# Altium footprint library 排针-排母-1.27.PcbLib: 152 footprints (part 4 of 10)
Each footprint in its own frame and in the unit in brackets; x right, y up, seen from the top. Pads: shape width x height; smd on the part's side, far side on the other; paste and mask are expansions set on the pad; w line width, h text height; cw(c..) or ccw(c..) is an arc to the next point about the centre after c.
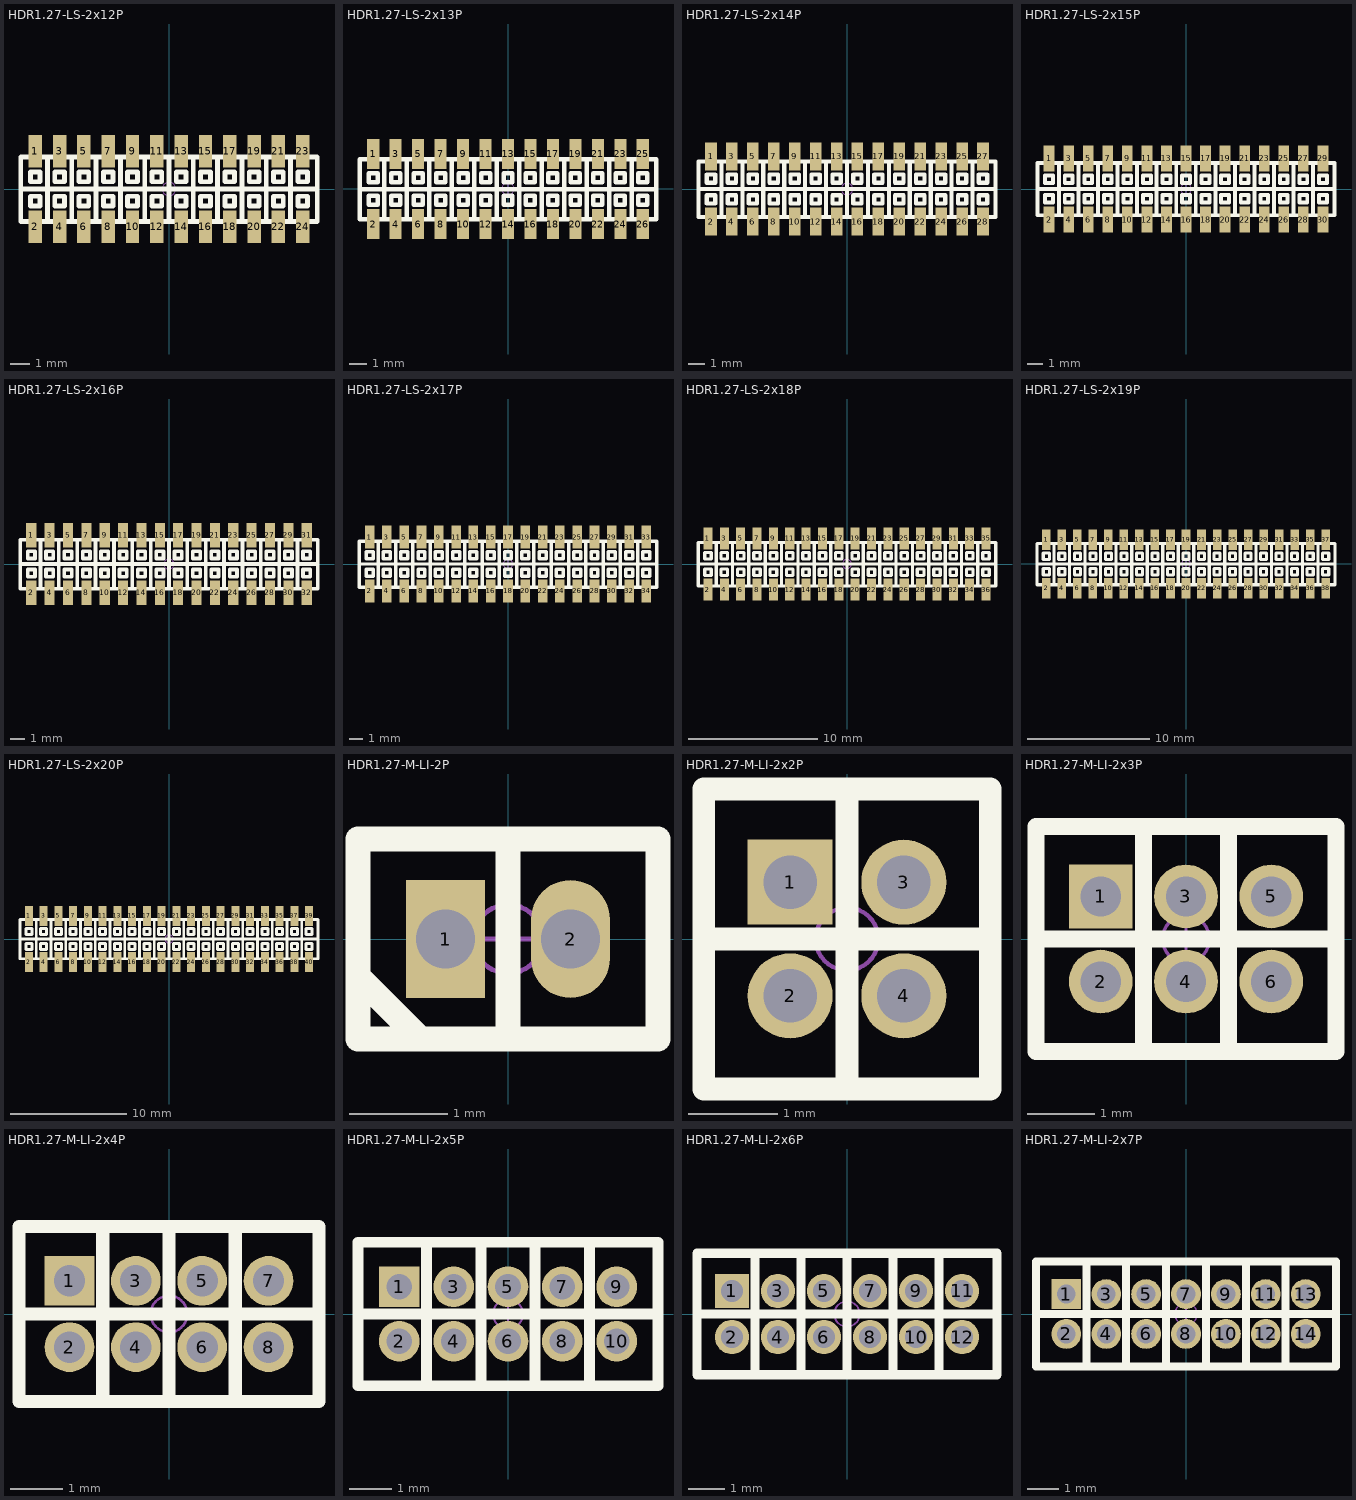
[diagram p3: the footprints below, top view; thin cyan lines are the x and y axes]

## HDR1.27-LS-2x12P [mm] "双排贴片排针，脚距：1.27mm"
pads (24):
  rect 0.7x1.7 smd: 1(-6.985,1.994) 2(-6.985,-1.968) 3(-5.715,1.994) 4(-5.715,-1.968) 5(-4.445,1.994) 6(-4.445,-1.968) 7(-3.175,1.994) 8(-3.175,-1.968) 9(-1.905,1.994) 10(-1.905,-1.968) 11(-0.635,1.994) 12(-0.635,-1.968) 13(0.635,1.994) 14(0.635,-1.968) 15(1.905,1.994) 16(1.905,-1.968) 17(3.175,1.994) 18(3.175,-1.968) 19(4.445,1.994) 20(4.445,-1.968) 21(5.715,1.994) 22(5.715,-1.968) 23(6.985,1.994) 24(6.985,-1.968)
Top Overlay:
  lines w0.254: -7.747,0.013 7.747,0.013 ; -6.35,-1.689 -6.35,1.689 ; -5.08,-1.689 -5.08,1.689 ; -3.81,-1.689 -3.81,1.689 ; -2.54,-1.689 -2.54,1.689 ; -1.27,-1.689 -1.27,1.689 ; 0,-1.689 0,1.689 ; 1.27,-1.689 1.27,1.689 ; 2.54,-1.689 2.54,1.689 ; 3.81,-1.689 3.81,1.689 ; 5.08,-1.689 5.08,1.689 ; 6.35,-1.689 6.35,1.689 ; -7.747,-1.689 7.747,-1.689 7.747,1.689 -7.747,1.689 -7.747,-1.689 ; -7.239,-0.876 -7.239,-0.368 -6.731,-0.368 -6.731,-0.876 -7.239,-0.876 ; -7.239,0.394 -6.731,0.394 -6.731,0.902 -7.239,0.902 -7.239,0.394 ; -5.969,-0.876 -5.461,-0.876 -5.461,-0.368 -5.969,-0.368 -5.969,-0.876 ; -5.969,0.394 -5.969,0.902 -5.461,0.902 -5.461,0.394 -5.969,0.394 ; -4.699,-0.876 -4.191,-0.876 -4.191,-0.368 -4.699,-0.368 -4.699,-0.876 ; -4.699,0.394 -4.699,0.902 -4.191,0.902 -4.191,0.394 -4.699,0.394 ; -3.429,-0.876 -2.921,-0.876 -2.921,-0.368 -3.429,-0.368 -3.429,-0.876 ; -3.429,0.394 -3.429,0.902 -2.921,0.902 -2.921,0.394 -3.429,0.394 ; -2.159,-0.876 -1.651,-0.876 -1.651,-0.368 -2.159,-0.368 -2.159,-0.876 ; -2.159,0.394 -2.159,0.902 -1.651,0.902 -1.651,0.394 -2.159,0.394 ; -0.889,-0.876 -0.381,-0.876 -0.381,-0.368 -0.889,-0.368 -0.889,-0.876 ; -0.889,0.394 -0.889,0.902 -0.381,0.902 -0.381,0.394 -0.889,0.394 ; 0.381,-0.876 0.889,-0.876 0.889,-0.368 0.381,-0.368 0.381,-0.876 ; 0.381,0.394 0.381,0.902 0.889,0.902 0.889,0.394 0.381,0.394 ; 1.651,-0.876 2.159,-0.876 2.159,-0.368 1.651,-0.368 1.651,-0.876 ; 1.651,0.394 1.651,0.902 2.159,0.902 2.159,0.394 1.651,0.394 ; 2.921,-0.876 3.429,-0.876 3.429,-0.368 2.921,-0.368 2.921,-0.876 ; 2.921,0.394 2.921,0.902 3.429,0.902 3.429,0.394 2.921,0.394 ; 4.191,-0.876 4.699,-0.876 4.699,-0.368 4.191,-0.368 4.191,-0.876 ; 4.191,0.394 4.191,0.902 4.699,0.902 4.699,0.394 4.191,0.394 ; 5.461,-0.876 5.969,-0.876 5.969,-0.368 5.461,-0.368 5.461,-0.876 ; 5.461,0.394 5.461,0.902 5.969,0.902 5.969,0.394 5.461,0.394 ; 6.731,-0.876 6.731,-0.368 7.239,-0.368 7.239,-0.876 6.731,-0.876 ; 6.731,0.394 7.239,0.394 7.239,0.902 6.731,0.902 6.731,0.394
Mechanical 15:
  circle w0.05: c0,0.013 r0.35
  lines w0.05: -0.5,0.013 0.5,0.013 ; 0,-0.487 0,0.513
3D body: height 4.25, standoff 0.04, extent -7.62,-2.737 -6.35,2.763
3D body: height 4.25, standoff 0.04, extent -6.35,-2.737 -5.08,2.763
3D body: height 4.25, standoff 0.04, extent -5.08,-2.737 -3.81,2.763
3D body: height 4.25, standoff 0.04, extent -3.81,-2.737 -2.54,2.763
3D body: height 4.25, standoff 0.04, extent -2.54,-2.737 -1.27,2.763
3D body: height 4.25, standoff 0.04, extent -1.27,-2.737 0,2.763
3D body: height 4.25, standoff 0.04, extent 0,-2.737 1.27,2.763
3D body: height 4.25, standoff 0.04, extent 1.27,-2.737 2.54,2.763
3D body: height 4.25, standoff 0.04, extent 2.54,-2.737 3.81,2.763
3D body: height 4.25, standoff 0.04, extent 3.81,-2.737 5.08,2.763
3D body: height 4.25, standoff 0.04, extent 5.08,-2.737 6.35,2.763
3D body: height 4.25, standoff 0.04, extent 6.35,-2.737 7.62,2.763

## HDR1.27-LS-2x13P [mm] "双排贴片排针，脚距：1.27mm"
pads (26):
  rect 0.7x1.7 smd: 1(-7.62,1.968) 2(-7.62,-1.994) 3(-6.35,1.968) 4(-6.35,-1.994) 5(-5.08,1.968) 6(-5.08,-1.994) 7(-3.81,1.968) 8(-3.81,-1.994) 9(-2.54,1.968) 10(-2.54,-1.994) 11(-1.27,1.968) 12(-1.27,-1.994) 13(0,1.968) 14(0,-1.994) 15(1.27,1.968) 16(1.27,-1.994) 17(2.54,1.968) 18(2.54,-1.994) 19(3.81,1.968) 20(3.81,-1.994) 21(5.08,1.968) 22(5.08,-1.994) 23(6.35,1.968) 24(6.35,-1.994) 25(7.62,1.968) 26(7.62,-1.994)
Top Overlay:
  lines w0.254: -8.382,-0.013 8.382,-0.013 ; -6.985,-1.714 -6.985,1.664 ; -5.715,-1.714 -5.715,1.664 ; -4.445,-1.714 -4.445,1.664 ; -3.175,-1.714 -3.175,1.664 ; -1.905,-1.714 -1.905,1.664 ; -0.635,-1.714 -0.635,1.664 ; 0.635,-1.714 0.635,1.664 ; 1.905,-1.714 1.905,1.664 ; 3.175,-1.714 3.175,1.664 ; 4.445,-1.714 4.445,1.664 ; 5.715,-1.714 5.715,1.664 ; 6.985,-1.714 6.985,1.664 ; -8.382,-1.714 -8.382,1.664 8.382,1.664 8.382,-1.714 -8.382,-1.714 ; -7.874,-0.902 -7.366,-0.902 -7.366,-0.394 -7.874,-0.394 -7.874,-0.902 ; -7.874,0.368 -7.874,0.876 -7.366,0.876 -7.366,0.368 -7.874,0.368 ; -6.604,-0.902 -6.604,-0.394 -6.096,-0.394 -6.096,-0.902 -6.604,-0.902 ; -6.604,0.368 -6.096,0.368 -6.096,0.876 -6.604,0.876 -6.604,0.368 ; -5.334,-0.902 -5.334,-0.394 -4.826,-0.394 -4.826,-0.902 -5.334,-0.902 ; -5.334,0.368 -4.826,0.368 -4.826,0.876 -5.334,0.876 -5.334,0.368 ; -4.064,-0.902 -4.064,-0.394 -3.556,-0.394 -3.556,-0.902 -4.064,-0.902 ; -4.064,0.368 -3.556,0.368 -3.556,0.876 -4.064,0.876 -4.064,0.368 ; -2.794,-0.902 -2.794,-0.394 -2.286,-0.394 -2.286,-0.902 -2.794,-0.902 ; -2.794,0.368 -2.286,0.368 -2.286,0.876 -2.794,0.876 -2.794,0.368 ; -1.524,-0.902 -1.524,-0.394 -1.016,-0.394 -1.016,-0.902 -1.524,-0.902 ; -1.524,0.368 -1.016,0.368 -1.016,0.876 -1.524,0.876 -1.524,0.368 ; -0.254,-0.902 -0.254,-0.394 0.254,-0.394 0.254,-0.902 -0.254,-0.902 ; -0.254,0.368 0.254,0.368 0.254,0.876 -0.254,0.876 -0.254,0.368 ; 1.016,-0.902 1.016,-0.394 1.524,-0.394 1.524,-0.902 1.016,-0.902 ; 1.016,0.368 1.524,0.368 1.524,0.876 1.016,0.876 1.016,0.368 ; 2.286,-0.902 2.286,-0.394 2.794,-0.394 2.794,-0.902 2.286,-0.902 ; 2.286,0.368 2.794,0.368 2.794,0.876 2.286,0.876 2.286,0.368 ; 3.556,-0.902 3.556,-0.394 4.064,-0.394 4.064,-0.902 3.556,-0.902 ; 3.556,0.368 4.064,0.368 4.064,0.876 3.556,0.876 3.556,0.368 ; 4.826,-0.902 4.826,-0.394 5.334,-0.394 5.334,-0.902 4.826,-0.902 ; 4.826,0.368 5.334,0.368 5.334,0.876 4.826,0.876 4.826,0.368 ; 6.096,-0.902 6.096,-0.394 6.604,-0.394 6.604,-0.902 6.096,-0.902 ; 6.096,0.368 6.604,0.368 6.604,0.876 6.096,0.876 6.096,0.368 ; 7.366,-0.902 7.366,-0.394 7.874,-0.394 7.874,-0.902 7.366,-0.902 ; 7.366,0.368 7.874,0.368 7.874,0.876 7.366,0.876 7.366,0.368
Mechanical 15:
  circle w0.05: c0,0 r0.35
  lines w0.05: -0.5,0 0.5,0 ; 0,-0.5 0,0.5
3D body: height 4.25, standoff 0.04, extent 6.985,-2.763 8.255,2.737
3D body: height 4.25, standoff 0.04, extent 5.715,-2.763 6.985,2.737
3D body: height 4.25, standoff 0.04, extent 4.445,-2.763 5.715,2.737
3D body: height 4.25, standoff 0.04, extent 3.175,-2.763 4.445,2.737
3D body: height 4.25, standoff 0.04, extent 1.905,-2.763 3.175,2.737
3D body: height 4.25, standoff 0.04, extent 0.635,-2.763 1.905,2.737
3D body: height 4.25, standoff 0.04, extent -0.635,-2.763 0.635,2.737
3D body: height 4.25, standoff 0.04, extent -1.905,-2.763 -0.635,2.737
3D body: height 4.25, standoff 0.04, extent -3.175,-2.763 -1.905,2.737
3D body: height 4.25, standoff 0.04, extent -4.445,-2.763 -3.175,2.737
3D body: height 4.25, standoff 0.04, extent -5.715,-2.763 -4.445,2.737
3D body: height 4.25, standoff 0.04, extent -6.985,-2.763 -5.715,2.737
3D body: height 4.25, standoff 0.04, extent -8.255,-2.763 -6.985,2.737

## HDR1.27-LS-2x14P [mm] "双排贴片排针，脚距：1.27mm"
pads (28):
  rect 0.7x1.7 smd: 1(-8.255,1.981) 2(-8.255,-1.981) 3(-6.985,1.981) 4(-6.985,-1.981) 5(-5.715,1.981) 6(-5.715,-1.981) 7(-4.445,1.981) 8(-4.445,-1.981) 9(-3.175,1.981) 10(-3.175,-1.981) 11(-1.905,1.981) 12(-1.905,-1.981) 13(-0.635,1.981) 14(-0.635,-1.981) 15(0.635,1.981) 16(0.635,-1.981) 17(1.905,1.981) 18(1.905,-1.981) 19(3.175,1.981) 20(3.175,-1.981) 21(4.445,1.981) 22(4.445,-1.981) 23(5.715,1.981) 24(5.715,-1.981) 25(6.985,1.981) 26(6.985,-1.981) 27(8.255,1.981) 28(8.255,-1.981)
Top Overlay:
  lines w0.254: -9.017,0 9.017,0 ; -7.62,-1.702 -7.62,1.676 ; -6.35,-1.702 -6.35,1.676 ; -5.08,-1.702 -5.08,1.676 ; -3.81,-1.702 -3.81,1.676 ; -2.54,-1.702 -2.54,1.676 ; -1.27,-1.702 -1.27,1.676 ; 0,-1.702 0,1.676 ; 1.27,-1.702 1.27,1.676 ; 2.54,-1.702 2.54,1.676 ; 3.81,-1.702 3.81,1.676 ; 5.08,-1.702 5.08,1.676 ; 6.35,-1.702 6.35,1.676 ; 7.62,-1.702 7.62,1.676 ; -9.017,-1.702 -9.017,1.676 9.017,1.676 9.017,-1.702 -9.017,-1.702 ; -8.509,-0.889 -8.001,-0.889 -8.001,-0.381 -8.509,-0.381 -8.509,-0.889 ; -8.509,0.381 -8.509,0.889 -8.001,0.889 -8.001,0.381 -8.509,0.381 ; -7.239,-0.889 -7.239,-0.381 -6.731,-0.381 -6.731,-0.889 -7.239,-0.889 ; -7.239,0.381 -6.731,0.381 -6.731,0.889 -7.239,0.889 -7.239,0.381 ; -5.969,-0.889 -5.969,-0.381 -5.461,-0.381 -5.461,-0.889 -5.969,-0.889 ; -5.969,0.381 -5.461,0.381 -5.461,0.889 -5.969,0.889 -5.969,0.381 ; -4.699,-0.889 -4.699,-0.381 -4.191,-0.381 -4.191,-0.889 -4.699,-0.889 ; -4.699,0.381 -4.191,0.381 -4.191,0.889 -4.699,0.889 -4.699,0.381 ; -3.429,-0.889 -3.429,-0.381 -2.921,-0.381 -2.921,-0.889 -3.429,-0.889 ; -3.429,0.381 -2.921,0.381 -2.921,0.889 -3.429,0.889 -3.429,0.381 ; -2.159,-0.889 -2.159,-0.381 -1.651,-0.381 -1.651,-0.889 -2.159,-0.889 ; -2.159,0.381 -1.651,0.381 -1.651,0.889 -2.159,0.889 -2.159,0.381 ; -0.889,-0.889 -0.889,-0.381 -0.381,-0.381 -0.381,-0.889 -0.889,-0.889 ; -0.889,0.381 -0.381,0.381 -0.381,0.889 -0.889,0.889 -0.889,0.381 ; 0.381,-0.889 0.381,-0.381 0.889,-0.381 0.889,-0.889 0.381,-0.889 ; 0.381,0.381 0.889,0.381 0.889,0.889 0.381,0.889 0.381,0.381 ; 1.651,-0.889 1.651,-0.381 2.159,-0.381 2.159,-0.889 1.651,-0.889 ; 1.651,0.381 2.159,0.381 2.159,0.889 1.651,0.889 1.651,0.381 ; 2.921,-0.889 2.921,-0.381 3.429,-0.381 3.429,-0.889 2.921,-0.889 ; 2.921,0.381 3.429,0.381 3.429,0.889 2.921,0.889 2.921,0.381 ; 4.191,-0.889 4.191,-0.381 4.699,-0.381 4.699,-0.889 4.191,-0.889 ; 4.191,0.381 4.699,0.381 4.699,0.889 4.191,0.889 4.191,0.381 ; 5.461,-0.889 5.461,-0.381 5.969,-0.381 5.969,-0.889 5.461,-0.889 ; 5.461,0.381 5.969,0.381 5.969,0.889 5.461,0.889 5.461,0.381 ; 6.731,-0.889 6.731,-0.381 7.239,-0.381 7.239,-0.889 6.731,-0.889 ; 6.731,0.381 7.239,0.381 7.239,0.889 6.731,0.889 6.731,0.381 ; 8.001,-0.889 8.001,-0.381 8.509,-0.381 8.509,-0.889 8.001,-0.889 ; 8.001,0.381 8.509,0.381 8.509,0.889 8.001,0.889 8.001,0.381
Mechanical 15:
  circle w0.05: c0,0 r0.35
  lines w0.05: -0.5,0 0.5,0 ; 0,-0.5 0,0.5
3D body: height 4.25, standoff 0.04, extent 7.62,-2.75 8.89,2.75
3D body: height 4.25, standoff 0.04, extent 6.35,-2.75 7.62,2.75
3D body: height 4.25, standoff 0.04, extent 5.08,-2.75 6.35,2.75
3D body: height 4.25, standoff 0.04, extent 3.81,-2.75 5.08,2.75
3D body: height 4.25, standoff 0.04, extent 2.54,-2.75 3.81,2.75
3D body: height 4.25, standoff 0.04, extent 1.27,-2.75 2.54,2.75
3D body: height 4.25, standoff 0.04, extent 0,-2.75 1.27,2.75
3D body: height 4.25, standoff 0.04, extent -1.27,-2.75 0,2.75
3D body: height 4.25, standoff 0.04, extent -2.54,-2.75 -1.27,2.75
3D body: height 4.25, standoff 0.04, extent -3.81,-2.75 -2.54,2.75
3D body: height 4.25, standoff 0.04, extent -5.08,-2.75 -3.81,2.75
3D body: height 4.25, standoff 0.04, extent -6.35,-2.75 -5.08,2.75
3D body: height 4.25, standoff 0.04, extent -7.62,-2.75 -6.35,2.75
3D body: height 4.25, standoff 0.04, extent -8.89,-2.75 -7.62,2.75

## HDR1.27-LS-2x15P [mm] "双排贴片排针，脚距：1.27mm"
pads (30):
  rect 0.7x1.7 smd: 1(-8.89,1.981) 2(-8.89,-1.981) 3(-7.62,1.981) 4(-7.62,-1.981) 5(-6.35,1.981) 6(-6.35,-1.981) 7(-5.08,1.981) 8(-5.08,-1.981) 9(-3.81,1.981) 10(-3.81,-1.981) 11(-2.54,1.981) 12(-2.54,-1.981) 13(-1.27,1.981) 14(-1.27,-1.981) 15(0,1.981) 16(0,-1.981) 17(1.27,1.981) 18(1.27,-1.981) 19(2.54,1.981) 20(2.54,-1.981) 21(3.81,1.981) 22(3.81,-1.981) 23(5.08,1.981) 24(5.08,-1.981) 25(6.35,1.981) 26(6.35,-1.981) 27(7.62,1.981) 28(7.62,-1.981) 29(8.89,1.981) 30(8.89,-1.981)
Top Overlay:
  lines w0.254: -9.652,0 9.652,0 ; -8.255,-1.702 -8.255,1.676 ; -6.985,-1.702 -6.985,1.676 ; -5.715,-1.702 -5.715,1.676 ; -4.445,-1.702 -4.445,1.676 ; -3.175,-1.702 -3.175,1.676 ; -1.905,-1.702 -1.905,1.676 ; -0.635,-1.702 -0.635,1.676 ; 0.635,-1.702 0.635,1.676 ; 1.905,-1.702 1.905,1.676 ; 3.175,-1.702 3.175,1.676 ; 4.445,-1.702 4.445,1.676 ; 5.715,-1.702 5.715,1.676 ; 6.985,-1.702 6.985,1.676 ; 8.255,-1.702 8.255,1.676 ; -9.652,-1.702 -9.652,1.676 9.652,1.676 9.652,-1.702 -9.652,-1.702 ; -9.144,-0.889 -8.636,-0.889 -8.636,-0.381 -9.144,-0.381 -9.144,-0.889 ; -9.144,0.381 -9.144,0.889 -8.636,0.889 -8.636,0.381 -9.144,0.381 ; -7.874,-0.889 -7.874,-0.381 -7.366,-0.381 -7.366,-0.889 -7.874,-0.889 ; -7.874,0.381 -7.366,0.381 -7.366,0.889 -7.874,0.889 -7.874,0.381 ; -6.604,-0.889 -6.604,-0.381 -6.096,-0.381 -6.096,-0.889 -6.604,-0.889 ; -6.604,0.381 -6.096,0.381 -6.096,0.889 -6.604,0.889 -6.604,0.381 ; -5.334,-0.889 -5.334,-0.381 -4.826,-0.381 -4.826,-0.889 -5.334,-0.889 ; -5.334,0.381 -4.826,0.381 -4.826,0.889 -5.334,0.889 -5.334,0.381 ; -4.064,-0.889 -4.064,-0.381 -3.556,-0.381 -3.556,-0.889 -4.064,-0.889 ; -4.064,0.381 -3.556,0.381 -3.556,0.889 -4.064,0.889 -4.064,0.381 ; -2.794,-0.889 -2.794,-0.381 -2.286,-0.381 -2.286,-0.889 -2.794,-0.889 ; -2.794,0.381 -2.286,0.381 -2.286,0.889 -2.794,0.889 -2.794,0.381 ; -1.524,-0.889 -1.524,-0.381 -1.016,-0.381 -1.016,-0.889 -1.524,-0.889 ; -1.524,0.381 -1.016,0.381 -1.016,0.889 -1.524,0.889 -1.524,0.381 ; -0.254,-0.889 -0.254,-0.381 0.254,-0.381 0.254,-0.889 -0.254,-0.889 ; -0.254,0.381 0.254,0.381 0.254,0.889 -0.254,0.889 -0.254,0.381 ; 1.016,-0.889 1.016,-0.381 1.524,-0.381 1.524,-0.889 1.016,-0.889 ; 1.016,0.381 1.524,0.381 1.524,0.889 1.016,0.889 1.016,0.381 ; 2.286,-0.889 2.286,-0.381 2.794,-0.381 2.794,-0.889 2.286,-0.889 ; 2.286,0.381 2.794,0.381 2.794,0.889 2.286,0.889 2.286,0.381 ; 3.556,-0.889 3.556,-0.381 4.064,-0.381 4.064,-0.889 3.556,-0.889 ; 3.556,0.381 4.064,0.381 4.064,0.889 3.556,0.889 3.556,0.381 ; 4.826,-0.889 4.826,-0.381 5.334,-0.381 5.334,-0.889 4.826,-0.889 ; 4.826,0.381 5.334,0.381 5.334,0.889 4.826,0.889 4.826,0.381 ; 6.096,-0.889 6.096,-0.381 6.604,-0.381 6.604,-0.889 6.096,-0.889 ; 6.096,0.381 6.604,0.381 6.604,0.889 6.096,0.889 6.096,0.381 ; 7.366,-0.889 7.366,-0.381 7.874,-0.381 7.874,-0.889 7.366,-0.889 ; 7.366,0.381 7.874,0.381 7.874,0.889 7.366,0.889 7.366,0.381 ; 8.636,-0.889 8.636,-0.381 9.144,-0.381 9.144,-0.889 8.636,-0.889 ; 8.636,0.381 9.144,0.381 9.144,0.889 8.636,0.889 8.636,0.381
Mechanical 15:
  circle w0.05: c0,0 r0.35
  lines w0.05: -0.5,0 0.5,0 ; 0,-0.5 0,0.5
3D body: height 4.25, standoff 0.04, extent 8.255,-2.75 9.525,2.75
3D body: height 4.25, standoff 0.04, extent 6.985,-2.75 8.255,2.75
3D body: height 4.25, standoff 0.04, extent 5.715,-2.75 6.985,2.75
3D body: height 4.25, standoff 0.04, extent 4.445,-2.75 5.715,2.75
3D body: height 4.25, standoff 0.04, extent 3.175,-2.75 4.445,2.75
3D body: height 4.25, standoff 0.04, extent 1.905,-2.75 3.175,2.75
3D body: height 4.25, standoff 0.04, extent 0.635,-2.75 1.905,2.75
3D body: height 4.25, standoff 0.04, extent -0.635,-2.75 0.635,2.75
3D body: height 4.25, standoff 0.04, extent -1.905,-2.75 -0.635,2.75
3D body: height 4.25, standoff 0.04, extent -3.175,-2.75 -1.905,2.75
3D body: height 4.25, standoff 0.04, extent -4.445,-2.75 -3.175,2.75
3D body: height 4.25, standoff 0.04, extent -5.715,-2.75 -4.445,2.75
3D body: height 4.25, standoff 0.04, extent -6.985,-2.75 -5.715,2.75
3D body: height 4.25, standoff 0.04, extent -8.255,-2.75 -6.985,2.75
3D body: height 4.25, standoff 0.04, extent -9.525,-2.75 -8.255,2.75

## HDR1.27-LS-2x16P [mm] "双排贴片排针，脚距：1.27mm"
pads (32):
  rect 0.7x1.7 smd: 1(-9.525,1.994) 2(-9.525,-1.968) 3(-8.255,1.994) 4(-8.255,-1.968) 5(-6.985,1.994) 6(-6.985,-1.968) 7(-5.715,1.994) 8(-5.715,-1.968) 9(-4.445,1.994) 10(-4.445,-1.968) 11(-3.175,1.994) 12(-3.175,-1.968) 13(-1.905,1.994) 14(-1.905,-1.968) 15(-0.635,1.994) 16(-0.635,-1.968) 17(0.635,1.994) 18(0.635,-1.968) 19(1.905,1.994) 20(1.905,-1.968) 21(3.175,1.994) 22(3.175,-1.968) 23(4.445,1.994) 24(4.445,-1.968) 25(5.715,1.994) 26(5.715,-1.968) 27(6.985,1.994) 28(6.985,-1.968) 29(8.255,1.994) 30(8.255,-1.968) 31(9.525,1.994) 32(9.525,-1.968)
Top Overlay:
  lines w0.254: -10.287,0.013 10.287,0.013 ; -8.89,-1.689 -8.89,1.689 ; -7.62,-1.689 -7.62,1.689 ; -6.35,-1.689 -6.35,1.689 ; -5.08,-1.689 -5.08,1.689 ; -3.81,-1.689 -3.81,1.689 ; -2.54,-1.689 -2.54,1.689 ; -1.27,-1.689 -1.27,1.689 ; 0,-1.689 0,1.689 ; 1.27,-1.689 1.27,1.689 ; 2.54,-1.689 2.54,1.689 ; 3.81,-1.689 3.81,1.689 ; 5.08,-1.689 5.08,1.689 ; 6.35,-1.689 6.35,1.689 ; 7.62,-1.689 7.62,1.689 ; 8.89,-1.689 8.89,1.689 ; -10.287,-1.689 -10.287,1.689 10.287,1.689 10.287,-1.689 -10.287,-1.689 ; -9.779,-0.876 -9.271,-0.876 -9.271,-0.368 -9.779,-0.368 -9.779,-0.876 ; -9.779,0.394 -9.779,0.902 -9.271,0.902 -9.271,0.394 -9.779,0.394 ; -8.509,-0.876 -8.509,-0.368 -8.001,-0.368 -8.001,-0.876 -8.509,-0.876 ; -8.509,0.394 -8.001,0.394 -8.001,0.902 -8.509,0.902 -8.509,0.394 ; -7.239,-0.876 -7.239,-0.368 -6.731,-0.368 -6.731,-0.876 -7.239,-0.876 ; -7.239,0.394 -6.731,0.394 -6.731,0.902 -7.239,0.902 -7.239,0.394 ; -5.969,-0.876 -5.969,-0.368 -5.461,-0.368 -5.461,-0.876 -5.969,-0.876 ; -5.969,0.394 -5.461,0.394 -5.461,0.902 -5.969,0.902 -5.969,0.394 ; -4.699,-0.876 -4.699,-0.368 -4.191,-0.368 -4.191,-0.876 -4.699,-0.876 ; -4.699,0.394 -4.191,0.394 -4.191,0.902 -4.699,0.902 -4.699,0.394 ; -3.429,-0.876 -3.429,-0.368 -2.921,-0.368 -2.921,-0.876 -3.429,-0.876 ; -3.429,0.394 -2.921,0.394 -2.921,0.902 -3.429,0.902 -3.429,0.394 ; -2.159,-0.876 -2.159,-0.368 -1.651,-0.368 -1.651,-0.876 -2.159,-0.876 ; -2.159,0.394 -1.651,0.394 -1.651,0.902 -2.159,0.902 -2.159,0.394 ; -0.889,-0.876 -0.889,-0.368 -0.381,-0.368 -0.381,-0.876 -0.889,-0.876 ; -0.889,0.394 -0.381,0.394 -0.381,0.902 -0.889,0.902 -0.889,0.394 ; 0.381,-0.876 0.381,-0.368 0.889,-0.368 0.889,-0.876 0.381,-0.876 ; 0.381,0.394 0.889,0.394 0.889,0.902 0.381,0.902 0.381,0.394 ; 1.651,-0.876 1.651,-0.368 2.159,-0.368 2.159,-0.876 1.651,-0.876 ; 1.651,0.394 2.159,0.394 2.159,0.902 1.651,0.902 1.651,0.394 ; 2.921,-0.876 2.921,-0.368 3.429,-0.368 3.429,-0.876 2.921,-0.876 ; 2.921,0.394 3.429,0.394 3.429,0.902 2.921,0.902 2.921,0.394 ; 4.191,-0.876 4.191,-0.368 4.699,-0.368 4.699,-0.876 4.191,-0.876 ; 4.191,0.394 4.699,0.394 4.699,0.902 4.191,0.902 4.191,0.394 ; 5.461,-0.876 5.461,-0.368 5.969,-0.368 5.969,-0.876 5.461,-0.876 ; 5.461,0.394 5.969,0.394 5.969,0.902 5.461,0.902 5.461,0.394 ; 6.731,-0.876 6.731,-0.368 7.239,-0.368 7.239,-0.876 6.731,-0.876 ; 6.731,0.394 7.239,0.394 7.239,0.902 6.731,0.902 6.731,0.394 ; 8.001,-0.876 8.001,-0.368 8.509,-0.368 8.509,-0.876 8.001,-0.876 ; 8.001,0.394 8.509,0.394 8.509,0.902 8.001,0.902 8.001,0.394 ; 9.271,-0.876 9.271,-0.368 9.779,-0.368 9.779,-0.876 9.271,-0.876 ; 9.271,0.394 9.779,0.394 9.779,0.902 9.271,0.902 9.271,0.394
Mechanical 15:
  circle w0.05: c0,0 r0.35
  lines w0.05: -0.5,0 0.5,0 ; 0,-0.5 0,0.5
3D body: height 4.25, standoff 0.04, extent 8.89,-2.737 10.16,2.763
3D body: height 4.25, standoff 0.04, extent 7.62,-2.737 8.89,2.763
3D body: height 4.25, standoff 0.04, extent 6.35,-2.737 7.62,2.763
3D body: height 4.25, standoff 0.04, extent 5.08,-2.737 6.35,2.763
3D body: height 4.25, standoff 0.04, extent 3.81,-2.737 5.08,2.763
3D body: height 4.25, standoff 0.04, extent 2.54,-2.737 3.81,2.763
3D body: height 4.25, standoff 0.04, extent 1.27,-2.737 2.54,2.763
3D body: height 4.25, standoff 0.04, extent 0,-2.737 1.27,2.763
3D body: height 4.25, standoff 0.04, extent -1.27,-2.737 0,2.763
3D body: height 4.25, standoff 0.04, extent -2.54,-2.737 -1.27,2.763
3D body: height 4.25, standoff 0.04, extent -3.81,-2.737 -2.54,2.763
3D body: height 4.25, standoff 0.04, extent -5.08,-2.737 -3.81,2.763
3D body: height 4.25, standoff 0.04, extent -6.35,-2.737 -5.08,2.763
3D body: height 4.25, standoff 0.04, extent -7.62,-2.737 -6.35,2.763
3D body: height 4.25, standoff 0.04, extent -8.89,-2.737 -7.62,2.763
3D body: height 4.25, standoff 0.04, extent -10.16,-2.737 -8.89,2.763

## HDR1.27-LS-2x17P [mm] "双排贴片排针，脚距：1.27mm"
pads (34):
  rect 0.7x1.7 smd: 1(-10.16,1.981) 2(-10.16,-1.981) 3(-8.89,1.981) 4(-8.89,-1.981) 5(-7.62,1.981) 6(-7.62,-1.981) 7(-6.35,1.981) 8(-6.35,-1.981) 9(-5.08,1.981) 10(-5.08,-1.981) 11(-3.81,1.981) 12(-3.81,-1.981) 13(-2.54,1.981) 14(-2.54,-1.981) 15(-1.27,1.981) 16(-1.27,-1.981) 17(0,1.981) 18(0,-1.981) 19(1.27,1.981) 20(1.27,-1.981) 21(2.54,1.981) 22(2.54,-1.981) 23(3.81,1.981) 24(3.81,-1.981) 25(5.08,1.981) 26(5.08,-1.981) 27(6.35,1.981) 28(6.35,-1.981) 29(7.62,1.981) 30(7.62,-1.981) 31(8.89,1.981) 32(8.89,-1.981) 33(10.16,1.981) 34(10.16,-1.981)
Top Overlay:
  drawing of 157 lines, arcs and shapes, not listed
Mechanical 15:
  circle w0.05: c0,0 r0.35
  lines w0.05: -0.5,0 0.5,0 ; 0,-0.5 0,0.5
3D body: height 4.25, standoff 0.04, extent 9.525,-2.75 10.795,2.75
3D body: height 4.25, standoff 0.04, extent 8.255,-2.75 9.525,2.75
3D body: height 4.25, standoff 0.04, extent 6.985,-2.75 8.255,2.75
3D body: height 4.25, standoff 0.04, extent 5.715,-2.75 6.985,2.75
3D body: height 4.25, standoff 0.04, extent 4.445,-2.75 5.715,2.75
3D body: height 4.25, standoff 0.04, extent 3.175,-2.75 4.445,2.75
3D body: height 4.25, standoff 0.04, extent 1.905,-2.75 3.175,2.75
3D body: height 4.25, standoff 0.04, extent 0.635,-2.75 1.905,2.75
3D body: height 4.25, standoff 0.04, extent -0.635,-2.75 0.635,2.75
3D body: height 4.25, standoff 0.04, extent -1.905,-2.75 -0.635,2.75
3D body: height 4.25, standoff 0.04, extent -3.175,-2.75 -1.905,2.75
3D body: height 4.25, standoff 0.04, extent -4.445,-2.75 -3.175,2.75
3D body: height 4.25, standoff 0.04, extent -5.715,-2.75 -4.445,2.75
3D body: height 4.25, standoff 0.04, extent -6.985,-2.75 -5.715,2.75
3D body: height 4.25, standoff 0.04, extent -8.255,-2.75 -6.985,2.75
3D body: height 4.25, standoff 0.04, extent -9.525,-2.75 -8.255,2.75
3D body: height 4.25, standoff 0.04, extent -10.795,-2.75 -9.525,2.75

## HDR1.27-LS-2x18P [mm] "双排贴片排针，脚距：1.27mm"
pads (36):
  rect 0.7x1.7 smd: 1(-10.795,1.994) 2(-10.795,-1.968) 3(-9.525,1.994) 4(-9.525,-1.968) 5(-8.255,1.994) 6(-8.255,-1.968) 7(-6.985,1.994) 8(-6.985,-1.968) 9(-5.715,1.994) 10(-5.715,-1.968) 11(-4.445,1.994) 12(-4.445,-1.968) 13(-3.175,1.994) 14(-3.175,-1.968) 15(-1.905,1.994) 16(-1.905,-1.968) 17(-0.635,1.994) 18(-0.635,-1.968) 19(0.635,1.994) 20(0.635,-1.968) 21(1.905,1.994) 22(1.905,-1.968) 23(3.175,1.994) 24(3.175,-1.968) 25(4.445,1.994) 26(4.445,-1.968) 27(5.715,1.994) 28(5.715,-1.968) 29(6.985,1.994) 30(6.985,-1.968) 31(8.255,1.994) 32(8.255,-1.968) 33(9.525,1.994) 34(9.525,-1.968) 35(10.795,1.994) 36(10.795,-1.968)
Top Overlay:
  drawing of 166 lines, arcs and shapes, not listed
Mechanical 15:
  circle w0.05: c0,0.013 r0.35
  lines w0.05: -0.5,0.013 0.5,0.013 ; 0,-0.487 0,0.513
3D body: height 4.25, standoff 0.04, extent 10.16,-2.737 11.43,2.763
3D body: height 4.25, standoff 0.04, extent 8.89,-2.737 10.16,2.763
3D body: height 4.25, standoff 0.04, extent 7.62,-2.737 8.89,2.763
3D body: height 4.25, standoff 0.04, extent 6.35,-2.737 7.62,2.763
3D body: height 4.25, standoff 0.04, extent 5.08,-2.737 6.35,2.763
3D body: height 4.25, standoff 0.04, extent 3.81,-2.737 5.08,2.763
3D body: height 4.25, standoff 0.04, extent 2.54,-2.737 3.81,2.763
3D body: height 4.25, standoff 0.04, extent 1.27,-2.737 2.54,2.763
3D body: height 4.25, standoff 0.04, extent 0,-2.737 1.27,2.763
3D body: height 4.25, standoff 0.04, extent -1.27,-2.737 0,2.763
3D body: height 4.25, standoff 0.04, extent -2.54,-2.737 -1.27,2.763
3D body: height 4.25, standoff 0.04, extent -3.81,-2.737 -2.54,2.763
3D body: height 4.25, standoff 0.04, extent -5.08,-2.737 -3.81,2.763
3D body: height 4.25, standoff 0.04, extent -6.35,-2.737 -5.08,2.763
3D body: height 4.25, standoff 0.04, extent -7.62,-2.737 -6.35,2.763
3D body: height 4.25, standoff 0.04, extent -8.89,-2.737 -7.62,2.763
3D body: height 4.25, standoff 0.04, extent -10.16,-2.737 -8.89,2.763
3D body: height 4.25, standoff 0.04, extent -11.43,-2.737 -10.16,2.763

## HDR1.27-LS-2x19P [mm] "双排贴片排针，脚距：1.27mm"
pads (38):
  rect 0.7x1.7 smd: 1(-11.43,1.968) 2(-11.43,-1.994) 3(-10.16,1.968) 4(-10.16,-1.994) 5(-8.89,1.968) 6(-8.89,-1.994) 7(-7.62,1.968) 8(-7.62,-1.994) 9(-6.35,1.968) 10(-6.35,-1.994) 11(-5.08,1.968) 12(-5.08,-1.994) 13(-3.81,1.968) 14(-3.81,-1.994) 15(-2.54,1.968) 16(-2.54,-1.994) 17(-1.27,1.968) 18(-1.27,-1.994) 19(0,1.968) 20(0,-1.994) 21(1.27,1.968) 22(1.27,-1.994) 23(2.54,1.968) 24(2.54,-1.994) 25(3.81,1.968) 26(3.81,-1.994) 27(5.08,1.968) 28(5.08,-1.994) 29(6.35,1.968) 30(6.35,-1.994) 31(7.62,1.968) 32(7.62,-1.994) 33(8.89,1.968) 34(8.89,-1.994) 35(10.16,1.968) 36(10.16,-1.994) 37(11.43,1.968) 38(11.43,-1.994)
Top Overlay:
  drawing of 175 lines, arcs and shapes, not listed
Mechanical 15:
  circle w0.05: c0,0 r0.35
  lines w0.05: -0.5,0 0.5,0 ; 0,-0.5 0,0.5
3D body: height 4.25, standoff 0.04, extent 10.795,-2.763 12.065,2.737
3D body: height 4.25, standoff 0.04, extent 9.525,-2.763 10.795,2.737
3D body: height 4.25, standoff 0.04, extent 8.255,-2.763 9.525,2.737
3D body: height 4.25, standoff 0.04, extent 6.985,-2.763 8.255,2.737
3D body: height 4.25, standoff 0.04, extent 5.715,-2.763 6.985,2.737
3D body: height 4.25, standoff 0.04, extent 4.445,-2.763 5.715,2.737
3D body: height 4.25, standoff 0.04, extent 3.175,-2.763 4.445,2.737
3D body: height 4.25, standoff 0.04, extent 1.905,-2.763 3.175,2.737
3D body: height 4.25, standoff 0.04, extent 0.635,-2.763 1.905,2.737
3D body: height 4.25, standoff 0.04, extent -0.635,-2.763 0.635,2.737
3D body: height 4.25, standoff 0.04, extent -1.905,-2.763 -0.635,2.737
3D body: height 4.25, standoff 0.04, extent -3.175,-2.763 -1.905,2.737
3D body: height 4.25, standoff 0.04, extent -4.445,-2.763 -3.175,2.737
3D body: height 4.25, standoff 0.04, extent -5.715,-2.763 -4.445,2.737
3D body: height 4.25, standoff 0.04, extent -6.985,-2.763 -5.715,2.737
3D body: height 4.25, standoff 0.04, extent -8.255,-2.763 -6.985,2.737
3D body: height 4.25, standoff 0.04, extent -9.525,-2.763 -8.255,2.737
3D body: height 4.25, standoff 0.04, extent -10.795,-2.763 -9.525,2.737
3D body: height 4.25, standoff 0.04, extent -12.065,-2.763 -10.795,2.737

## HDR1.27-LS-2x20P [mm] "双排贴片排针，脚距：1.27mm"
pads (40):
  rect 0.7x1.7 smd: 1(-12.065,1.981) 2(-12.065,-1.981) 3(-10.795,1.981) 4(-10.795,-1.981) 5(-9.525,1.981) 6(-9.525,-1.981) 7(-8.255,1.981) 8(-8.255,-1.981) 9(-6.985,1.981) 10(-6.985,-1.981) 11(-5.715,1.981) 12(-5.715,-1.981) 13(-4.445,1.981) 14(-4.445,-1.981) 15(-3.175,1.981) 16(-3.175,-1.981) 17(-1.905,1.981) 18(-1.905,-1.981) 19(-0.635,1.981) 20(-0.635,-1.981) 21(0.635,1.981) 22(0.635,-1.981) 23(1.905,1.981) 24(1.905,-1.981) 25(3.175,1.981) 26(3.175,-1.981) 27(4.445,1.981) 28(4.445,-1.981) 29(5.715,1.981) 30(5.715,-1.981) 31(6.985,1.981) 32(6.985,-1.981) 33(8.255,1.981) 34(8.255,-1.981) 35(9.525,1.981) 36(9.525,-1.981) 37(10.795,1.981) 38(10.795,-1.981) 39(12.065,1.981) 40(12.065,-1.981)
Top Overlay:
  drawing of 184 lines, arcs and shapes, not listed
Mechanical 15:
  circle w0.05: c0,0 r0.35
  lines w0.05: -0.5,0 0.5,0 ; 0,-0.5 0,0.5
3D body: height 4.25, standoff 0.04, extent 11.43,-2.75 12.7,2.75
3D body: height 4.25, standoff 0.04, extent 10.16,-2.75 11.43,2.75
3D body: height 4.25, standoff 0.04, extent 8.89,-2.75 10.16,2.75
3D body: height 4.25, standoff 0.04, extent 7.62,-2.75 8.89,2.75
3D body: height 4.25, standoff 0.04, extent 6.35,-2.75 7.62,2.75
3D body: height 4.25, standoff 0.04, extent 5.08,-2.75 6.35,2.75
3D body: height 4.25, standoff 0.04, extent 3.81,-2.75 5.08,2.75
3D body: height 4.25, standoff 0.04, extent 2.54,-2.75 3.81,2.75
3D body: height 4.25, standoff 0.04, extent 1.27,-2.75 2.54,2.75
3D body: height 4.25, standoff 0.04, extent 0,-2.75 1.27,2.75
3D body: height 4.25, standoff 0.04, extent -1.27,-2.75 0,2.75
3D body: height 4.25, standoff 0.04, extent -2.54,-2.75 -1.27,2.75
3D body: height 4.25, standoff 0.04, extent -3.81,-2.75 -2.54,2.75
3D body: height 4.25, standoff 0.04, extent -5.08,-2.75 -3.81,2.75
3D body: height 4.25, standoff 0.04, extent -6.35,-2.75 -5.08,2.75
3D body: height 4.25, standoff 0.04, extent -7.62,-2.75 -6.35,2.75
3D body: height 4.25, standoff 0.04, extent -8.89,-2.75 -7.62,2.75
3D body: height 4.25, standoff 0.04, extent -10.16,-2.75 -8.89,2.75
3D body: height 4.25, standoff 0.04, extent -11.43,-2.75 -10.16,2.75
3D body: height 4.25, standoff 0.04, extent -12.7,-2.75 -11.43,2.75

## HDR1.27-M-LI-2P [mm] "直插，脚距：1.27mm"
pads (2):
  rect 0.8x1.2 hole 0.6: 1(-0.635,0)
  oval 0.8x1.2 hole 0.6: 2(0.635,0)
Top Overlay:
  lines w0.254: -1.524,-0.254 -1.524,-0.381 -0.889,-1.016 ; 0,-1.016 0,1.016 ; -1.524,-1.016 -1.524,1.016 1.524,1.016 1.524,-1.016 -1.524,-1.016
Mechanical 15:
  circle w0.05: c0,0 r0.35
  lines w0.05: -0.5,0 0.5,0 ; 0,-0.5 0,0.5
3D body: height 4.5, standoff -2.1, extent -1.435,-0.9 1.435,0.9

## HDR1.27-M-LI-2x2P [mm] "双排直插排母，脚距：1.27mm"
pads (4):
  rect 0.95x0.95 hole 0.6: 1(-0.635,0.635)
  round 0.95 hole 0.6: 2(-0.635,-0.635) 3(0.635,0.635) 4(0.635,-0.635)
Top Overlay:
  lines w0.254: -1.6,0 1.6,0 ; 0,-1.65 0,1.65 ; -1.6,-1.676 -1.6,1.676 1.6,1.676 1.6,-1.676 -1.6,-1.676
Mechanical 15:
  circle w0.05: c0,0 r0.35
  lines w0.05: -0.5,0 0.5,0 ; 0,-0.5 0,0.5
3D body: height 4.45, standoff -2.17, extent 0,-1.55 1.47,1.55
3D body: height 4.45, standoff -2.17, extent -1.47,-1.55 0,1.55

## HDR1.27-M-LI-2x3P [mm] "双排直插排母，脚距：1.27mm"
pads (6):
  rect 0.95x0.95 hole 0.6: 1(-1.27,0.635)
  round 0.95 hole 0.6: 2(-1.27,-0.635) 3(0,0.635) 4(0,-0.635) 5(1.27,0.635) 6(1.27,-0.635)
Top Overlay:
  lines w0.254: -2.235,0 2.235,0 ; -0.635,-1.65 -0.635,1.65 ; 0.635,-1.65 0.635,1.65 ; -2.235,-1.676 -2.235,1.676 2.235,1.676 2.235,-1.676 -2.235,-1.676
Mechanical 15:
  circle w0.05: c0,0 r0.35
  lines w0.05: -0.5,0 0.5,0 ; 0,-0.5 0,0.5
3D body: height 4.45, standoff -2.17, extent 0.635,-1.55 2.105,1.55
3D body: height 4.45, standoff -2.17, extent -2.105,-1.55 -0.635,1.55
3D body: height 4.45, standoff -2.17, extent -0.635,-1.55 0.635,1.55

## HDR1.27-M-LI-2x4P [mm] "双排直插排母，脚距：1.27mm"
pads (8):
  rect 0.95x0.95 hole 0.6: 1(-1.905,0.635)
  round 0.95 hole 0.6: 2(-1.905,-0.635) 3(-0.635,0.635) 4(-0.635,-0.635) 5(0.635,0.635) 6(0.635,-0.635) 7(1.905,0.635) 8(1.905,-0.635)
Top Overlay:
  lines w0.254: -2.87,0 2.87,0 ; -1.27,-1.65 -1.27,1.65 ; 0,-1.65 0,1.65 ; 1.27,-1.65 1.27,1.65 ; -2.87,-1.676 2.87,-1.676 2.87,1.676 -2.87,1.676 -2.87,-1.676
Mechanical 15:
  circle w0.05: c0,0 r0.35
  lines w0.05: -0.5,0 0.5,0 ; 0,-0.5 0,0.5
3D body: height 4.45, standoff -2.17, extent 0,-1.55 1.27,1.55
3D body: height 4.45, standoff -2.17, extent -1.27,-1.55 0,1.55
3D body: height 4.45, standoff -2.17, extent -2.74,-1.55 -1.27,1.55
3D body: height 4.45, standoff -2.17, extent 1.27,-1.55 2.74,1.55

## HDR1.27-M-LI-2x5P [mm] "双排直插排母，脚距：1.27mm"
pads (10):
  rect 0.95x0.95 hole 0.6: 1(-2.54,0.635)
  round 0.95 hole 0.6: 2(-2.54,-0.635) 3(-1.27,0.635) 4(-1.27,-0.635) 5(0,0.635) 6(0,-0.635) 7(1.27,0.635) 8(1.27,-0.635) 9(2.54,0.635) 10(2.54,-0.635)
Top Overlay:
  lines w0.254: -3.505,0 3.505,0 ; -1.905,-1.65 -1.905,1.65 ; -0.635,-1.65 -0.635,1.65 ; 0.635,-1.65 0.635,1.65 ; 1.905,-1.65 1.905,1.65 ; -3.505,-1.676 3.505,-1.676 3.505,1.676 -3.505,1.676 -3.505,-1.676
Mechanical 15:
  circle w0.05: c0,0 r0.35
  lines w0.05: -0.5,0 0.5,0 ; 0,-0.5 0,0.5
3D body: height 4.45, standoff -2.17, extent 0.635,-1.55 1.905,1.55
3D body: height 4.45, standoff -2.17, extent -0.635,-1.55 0.635,1.55
3D body: height 4.45, standoff -2.17, extent -1.905,-1.55 -0.635,1.55
3D body: height 4.45, standoff -2.17, extent -3.375,-1.55 -1.905,1.55
3D body: height 4.45, standoff -2.17, extent 1.905,-1.55 3.375,1.55

## HDR1.27-M-LI-2x6P [mm] "双排直插排母，脚距：1.27mm"
pads (12):
  rect 0.95x0.95 hole 0.6: 1(-3.175,0.635)
  round 0.95 hole 0.6: 2(-3.175,-0.635) 3(-1.905,0.635) 4(-1.905,-0.635) 5(-0.635,0.635) 6(-0.635,-0.635) 7(0.635,0.635) 8(0.635,-0.635) 9(1.905,0.635) 10(1.905,-0.635) 11(3.175,0.635) 12(3.175,-0.635)
Top Overlay:
  lines w0.254: -4.14,0 4.14,0 ; -2.54,-1.65 -2.54,1.65 ; -1.27,-1.65 -1.27,1.65 ; 0,-1.65 0,1.65 ; 1.27,-1.65 1.27,1.65 ; 2.54,-1.65 2.54,1.65 ; -4.14,-1.676 4.14,-1.676 4.14,1.676 -4.14,1.676 -4.14,-1.676
Mechanical 15:
  circle w0.05: c0,0 r0.35
  lines w0.05: -0.5,0 0.5,0 ; 0,-0.5 0,0.5
3D body: height 4.45, standoff -2.17, extent 1.27,-1.55 2.54,1.55
3D body: height 4.45, standoff -2.17, extent 0,-1.55 1.27,1.55
3D body: height 4.45, standoff -2.17, extent -1.27,-1.55 0,1.55
3D body: height 4.45, standoff -2.17, extent -2.54,-1.55 -1.27,1.55
3D body: height 4.45, standoff -2.17, extent -4.01,-1.55 -2.54,1.55
3D body: height 4.45, standoff -2.17, extent 2.54,-1.55 4.01,1.55

## HDR1.27-M-LI-2x7P [mm] "双排直插排母，脚距：1.27mm"
pads (14):
  rect 0.95x0.95 hole 0.6: 1(-3.81,0.635)
  round 0.95 hole 0.6: 2(-3.81,-0.635) 3(-2.54,0.635) 4(-2.54,-0.635) 5(-1.27,0.635) 6(-1.27,-0.635) 7(0,0.635) 8(0,-0.635) 9(1.27,0.635) 10(1.27,-0.635) 11(2.54,0.635) 12(2.54,-0.635) 13(3.81,0.635) 14(3.81,-0.635)
Top Overlay:
  lines w0.254: -4.775,0 4.775,0 ; -3.175,-1.65 -3.175,1.65 ; -1.905,-1.65 -1.905,1.65 ; -0.635,-1.65 -0.635,1.65 ; 0.635,-1.65 0.635,1.65 ; 1.905,-1.65 1.905,1.65 ; 3.175,-1.65 3.175,1.65 ; -4.775,-1.676 4.775,-1.676 4.775,1.676 -4.775,1.676 -4.775,-1.676
Mechanical 15:
  circle w0.05: c0,0 r0.35
  lines w0.05: -0.5,0 0.5,0 ; 0,-0.5 0,0.5
3D body: height 4.45, standoff -2.17, extent 1.905,-1.55 3.175,1.55
3D body: height 4.45, standoff -2.17, extent 0.635,-1.55 1.905,1.55
3D body: height 4.45, standoff -2.17, extent -0.635,-1.55 0.635,1.55
3D body: height 4.45, standoff -2.17, extent -1.905,-1.55 -0.635,1.55
3D body: height 4.45, standoff -2.17, extent -3.175,-1.55 -1.905,1.55
3D body: height 4.45, standoff -2.17, extent -4.645,-1.55 -3.175,1.55
3D body: height 4.45, standoff -2.17, extent 3.175,-1.55 4.645,1.55